# Altium footprint library PERCRO_footprints.PcbLib: 177 footprints (part 2 of 12)
Each footprint in its own frame and in the unit in brackets; x right, y up, seen from the top. Pads: shape width x height; smd on the part's side, far side on the other; paste and mask are expansions set on the pad; w line width, h text height; cw(c..) or ccw(c..) is an arc to the next point about the centre after c.
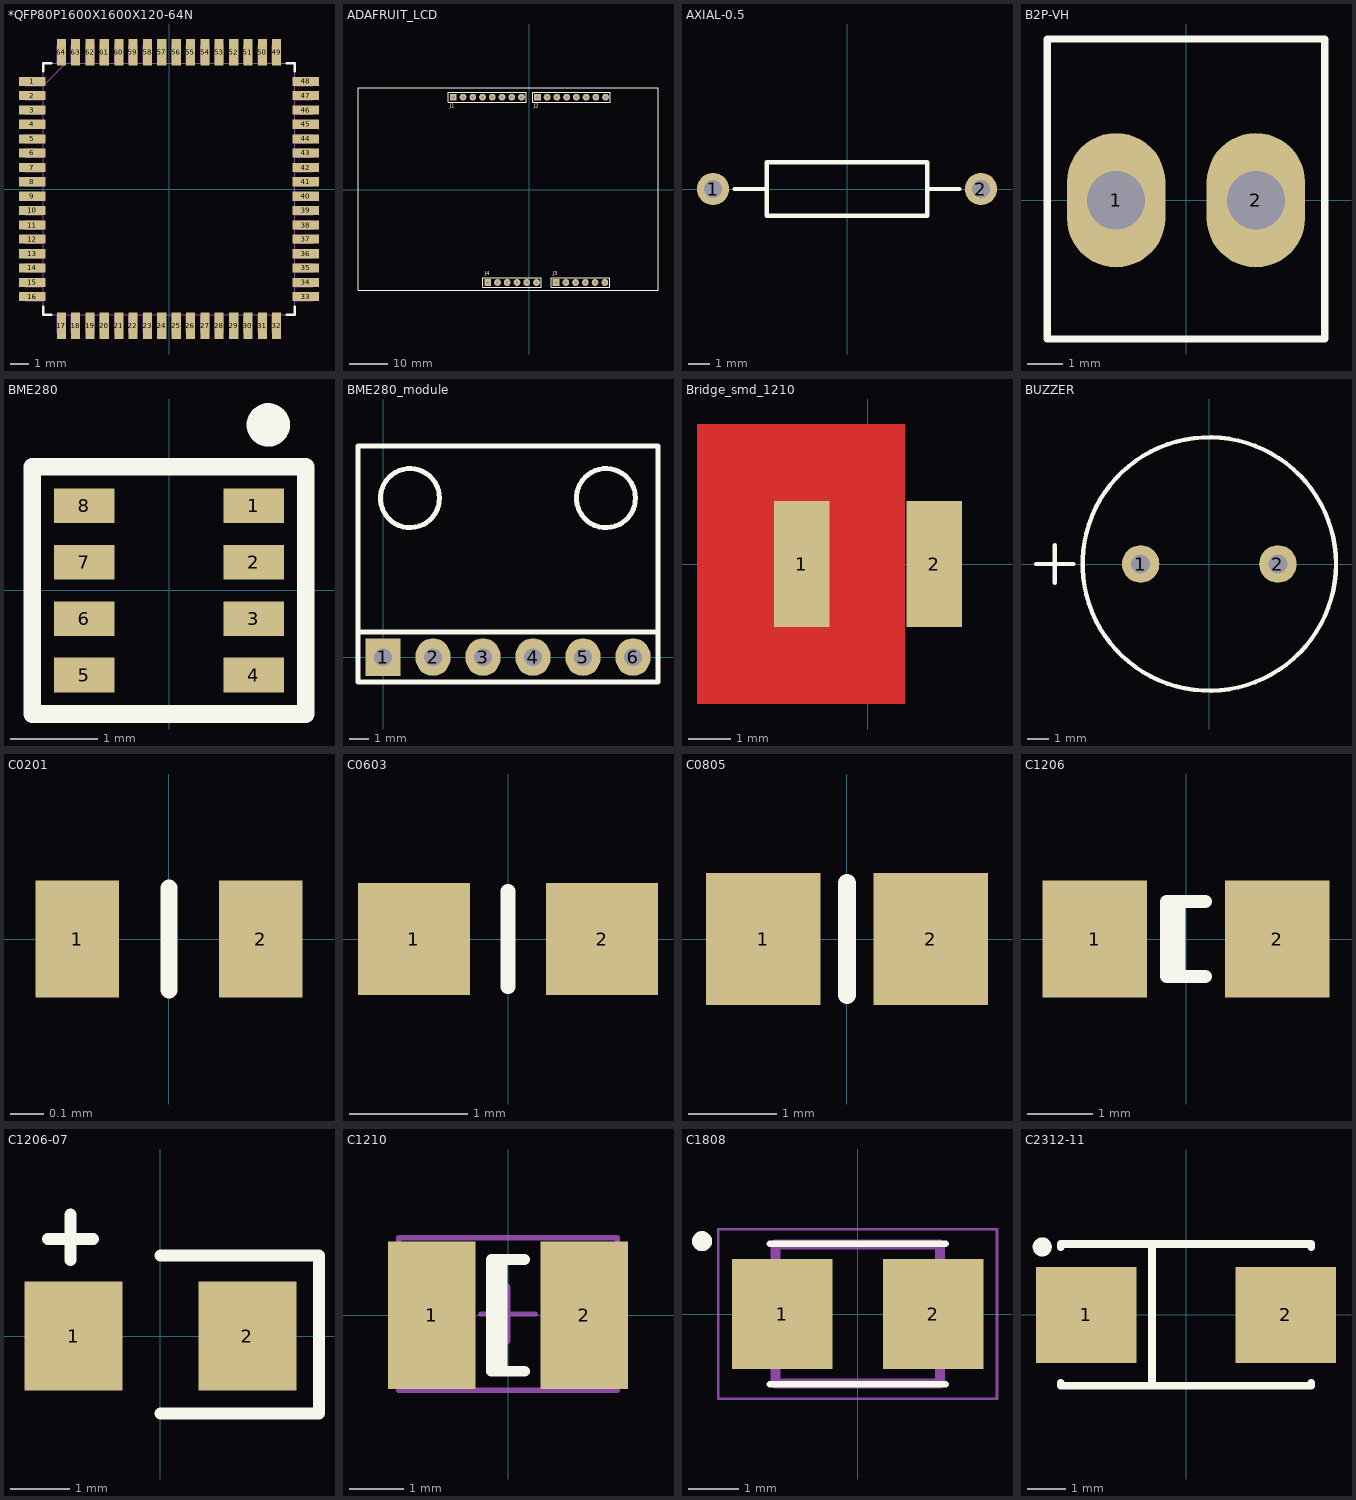
[diagram p1: the footprints below, top view; thin cyan lines are the x and y axes]

## *QFP80P1600X1600X120-64N [mil]
pads (64):
  rect 58x20 smd: 1(-300,236) 2(-300,205) 3(-300,173) 4(-300,142) 5(-300,110) 6(-300,79) 7(-300,47) 8(-300,16) 9(-300,-16) 10(-300,-47) 11(-300,-79) 12(-300,-110) 13(-300,-142) 14(-300,-173) 15(-300,-205) 16(-300,-236) 33(300,-236) 34(300,-205) 35(300,-173) 36(300,-142) 37(300,-110) 38(300,-79) 39(300,-47) 40(300,-16) 41(300,16) 42(300,47) 43(300,79) 44(300,110) 45(300,142) 46(300,173) 47(300,205) 48(300,236)
  rect 20x58 smd: 17(-236,-300) 18(-205,-300) 19(-173,-300) 20(-142,-300) 21(-110,-300) 22(-79,-300) 23(-47,-300) 24(-16,-300) 25(16,-300) 26(47,-300) 27(79,-300) 28(110,-300) 29(142,-300) 30(173,-300) 31(205,-300) 32(236,-300) 49(236,300) 50(205,300) 51(173,300) 52(142,300) 53(110,300) 54(79,300) 55(47,300) 56(16,300) 57(-16,300) 58(-47,300) 59(-79,300) 60(-110,300) 61(-142,300) 62(-173,300) 63(-205,300) 64(-236,300)
Top Overlay:
  lines w6: -276,-259 -276,-276 -259,-276 ; -276,259 -276,276 -259,276 ; 259,-276 276,-276 276,-259 ; 259,276 276,276 276,259
Mechanical 4:
  drawing of 662 lines, arcs and shapes, not listed

## ADAFRUIT_LCD [mil] "ADAFRUIT_LCD_2.8 in"
pads (28):
  rect 70x70 hole 35: 1(-781.5,951.18) 9(81.5,951.18) 22(273.62,-951.18) 28(-427.95,-951.18)
  round 70 hole 35: 2(-681.5,951.18) 3(-581.5,951.18) 4(-481.5,951.18) 5(-381.5,951.18) 6(-281.5,951.18) 7(-181.5,951.18) 8(-81.5,951.18) 10(181.5,951.18) 11(281.5,951.18) 12(381.5,951.18) 13(481.5,951.18) 14(581.5,951.18) 15(681.5,951.18) 16(781.5,951.18) 17(773.62,-951.18) 18(673.62,-951.18) 19(573.62,-951.18) 20(473.62,-951.18) 21(373.62,-951.18) 23(72.05,-951.18) 24(-27.95,-951.18) 25(-127.95,-951.18) 26(-227.95,-951.18) 27(-327.95,-951.18)
Top Overlay:
  lines w7.87: -831.5,901.18 -831.5,1001.18 -31.5,1001.18 -31.5,901.18 -831.5,901.18 ; -477.95,-1001.18 122.05,-1001.18 122.05,-901.18 -477.95,-901.18 -477.95,-1001.18 ; 31.5,901.18 31.5,1001.18 831.5,1001.18 831.5,901.18 31.5,901.18 ; 223.62,-1001.18 823.62,-1001.18 823.62,-901.18 223.62,-901.18 223.62,-1001.18
  lines w10: -1759.84,-1028.74 -1759.84,1046.06 1319.69,1046.06 1319.69,-1028.74 -1759.84,-1028.74
  text "J1" at -819.84,841.26 h40
  text "J3" at 240.16,-878.74 h40
  text "J4" at -459.84,-878.74 h40
  text "J2" at 43.15,841.26 h40
3D body "Elegoo_2.8_TFT_LCD_Display.stp": height 759.84, standoff 94.49, extent -1761.34,-1035.35 1321.33,1047.33
3D body "female_header_a-bl254-eg-g08d.stp": height 334.65, standoff -125.98, extent -836.41,901.98 -26.56,1000.4
3D body "female_header_a-bl254-eg-g06d.stp": height 330.27, standoff -130.36, extent -482.86,-1000.39 126.98,-901.96
3D body "female_header_a-bl254-eg-g06d.stp": height 334.65, standoff -125.98, extent 218.71,-1000.38 828.55,-901.96
3D body "female_header_a-bl254-eg-g08d.stp": height 334.65, standoff -125.98, extent 26.58,901.98 836.43,1000.4

## AXIAL-0.5 [mil] "Axial Device, Thru-Hole; 2 Leads; 0.5 in Pin Spacing"
height 100
pads (2):
  round 60 hole 33.46: 1(-250,0) 2(250,0)
Top Overlay:
  lines w7.87: -210,0 -150,0 ; 150,0 210,0 ; -150,-50 150,-50 150,50 -150,50 -150,-50

## B2P-VH [mil] "Header 1x2 degrees"
pads (2):
  oval 110x150 hole 64.96: 1(-78,0) 2(78,0)
Top Overlay:
  lines w8: -155,-155 -155,180 155,180 155,-155 -155,-155
3D body "B2P-VH.STEP": height 429.13, standoff -145.67, extent -154.78,-153.55 154.67,181.09

## BME280 [mm]
pads (8):
  rect 0.7x0.4 smd: 1(0.975,0.975) 2(0.975,0.325) 3(0.975,-0.325) 4(0.975,-0.975) 5(-0.975,-0.975) 6(-0.975,-0.325) 7(-0.975,0.325) 8(-0.975,0.975)
Top Overlay:
  circle w0.25: c1.143,1.905 r0.125
  lines w0.203: -1.575,-1.422 0,-1.422 1.575,-1.422 1.575,0 1.575,1.422 0,1.422 -1.575,1.422 -1.575,0 -1.575,-1.422
3D body "User Library-BME280-1.STEP": height 0.93, standoff 0, extent -1.25,-1.251 1.25,1.249

## BME280_module [mil] "Module sensor temp, humidity, presion"
pads (6):
  rect 70x75 hole 35.43: 1(0,0)
  oval 70x75 hole 35.43: 2(100,0) 3(200,0) 4(300,0) 5(400,0) 6(500,0)
Top Overlay:
  circle w10: c446,318 r59.06
  circle w10: c54,318 r59.06
  lines w10: -50,50 550,50 ; -50,-50 -50,422.44 550,422.44 550,-50 -50,-50
3D body "Module_bme280.STEP": height 218.11, standoff -222.83, extent -50,-49.99 553.94,402.76

## Bridge_smd_1210 [mm]
pads (2):
  rect 1.3x2.95 smd: 1(-1.55,0) 2(1.55,0)
Top Layer:
  pour cut-out: 0.86,-3.273 -4.01,-3.273 -4.01,3.273 0.86,3.273
3D body "Res 1210 (3225).step": height 0.57, standoff 0, extent -1.55,-1.295 1.55,1.307

## BUZZER [mil]
pads (2):
  round 70 hole 35: 1(-127.95,0) 2(127.95,0)
Top Overlay:
  circle w8: c0,0 r236.22
  lines w8: -322.95,0 -252.95,0 ; -287.95,-35 -287.95,35

## C0201 [mm]
pads (2):
  rect 0.25x0.35 smd: 1(-0.275,0) 2(0.275,0)
Top Overlay:
  lines w0.051: 0,-0.152 0,0.152
3D body: height 0.3, standoff 0, extent -0.305,-0.178 -0.152,0.178
3D body: height 0.3, standoff 0, extent 0.152,-0.178 0.305,0.178
3D body: height 0.25, standoff 0, extent -0.305,-0.152 0.305,0.153

## C0603 [mm]
pads (2):
  rect 0.95x0.95 smd: 1(-0.8,0) 2(0.8,0)
Top Overlay:
  lines w0.127: 0,-0.4 0,0.406 ; 0,0.406 0,0.406 ; 0,-0.406 0,-0.406
3D body "CAPACITOR SMD C0603.step": height 0.8, standoff 0, extent -0.797,-0.4 0.803,0.4

## C0805 [mm]
pads (2):
  rect 1.3x1.5 smd: 1(-0.95,0) 2(0.95,0)
Top Overlay:
  lines w0.2: 0,-0.634 0,0.634 ; 0,-0.634 0,-0.634 ; 0,0.634 0,0.634
3D body "C0805.step": height 0.95, standoff 0, extent -1,-0.6 1,0.6

## C1206 [mm] "Chip Capacitor, Body 3.2x1.6mm, IPC High Density"
height 0.85
pads (2):
  rect 1.6x1.8 smd: 1(-1.4,0) 2(1.4,0)
Top Overlay:
  lines w0.2: -0.11,-0.574 -0.11,0.574 ; 0.3,-0.574 -0.3,-0.574 -0.3,0.574 0.3,0.574
3D body "CAPACITOR C1206.step": height 1, standoff 0, extent -1.6,-0.8 1.6,0.8

## C1206-07 [mil]
pads (2):
  rect 64.62x72 smd: 1(-57.31,0) 2(57.31,0)
Top Overlay:
  lines w7.87: -74.32,64.02 -44.32,64.02 ; -59.32,50.03 -59.32,80.03 ; 0,-50.98 104.61,-50.98 104.61,53.15 0,53.15
3D body "Tantalum Capacitor Case A.STEP": height 64.96, standoff 0, extent -66.62,-31.49 66.86,31.5

## C1210 [mm] "Chip Capacitor, Body 3.2x2.5mm, IPC High Density"
height 1.3
pads (2):
  rect 1.6x2.7 smd: 1(-1.4,0) 2(1.4,0)
Top Overlay:
  lines w0.2: -0.11,-1.024 -0.11,1.024 ; 0.3,-1.024 -0.3,-1.024 -0.3,1.024 0.3,1.024
Mechanical 15:
  lines w0.1: -0.5,0.025 0.5,0.025 ; 0,-0.475 0,0.525 ; -2,-1.375 2,-1.375 2,1.425 -2,1.425 -2,-1.375
3D body "C1210.step": height 1.3, standoff 0, extent -1.615,-1.234 1.585,1.266

## C1808 [mm]
pads (2):
  rect 2x2.2 smd: 1(-1.5,0) 2(1.5,0)
Top Overlay:
  circle w0.2: c-3.1,1.45 r0.1
  lines w0.127: -1.75,-1.4 1.75,-1.4 ; -1.75,1.4 1.75,1.4
Mechanical 1:
  lines w0.051: -2.773,-1.683 2.773,-1.683 2.773,1.683 -2.773,1.683 -2.773,-1.683
  lines w0.152: -1.778,-1.016 -1.778,1.016 ; 1.778,-1.016 1.778,1.016
  lines w0.203: -1.637,-1.383 -1.637,1.383 1.637,1.383 1.637,-1.383 -1.637,-1.383
3D body "C1808_(4520).step": height 1.25, standoff 0, extent -2.25,-1.015 2.25,1.015

## C2312-11 [mm]
pads (2):
  rect 2.62x2.5 smd: 1(-2.61,0) 2(2.61,0)
Top Overlay:
  circle w0.25: c-3.757,1.778 r0.125
  lines w0.2: -3.272,-1.776 -3.272,-1.854 3.272,-1.854 3.272,-1.776 ; -3.272,1.776 -3.272,1.854 3.272,1.854 3.272,1.776 ; -0.889,-1.854 -0.889,1.854
3D body "C2312-11.step": height 2.8, standoff 0, extent -3.15,-1.75 3.15,1.75